# Altium footprint library PcbLibLafe.PcbLib: 297 footprints (part 10 of 19)
Each footprint in its own frame and in the unit in brackets; x right, y up, seen from the top. Pads: shape width x height; smd on the part's side, far side on the other; paste and mask are expansions set on the pad; w line width, h text height; cw(c..) or ccw(c..) is an arc to the next point about the centre after c.
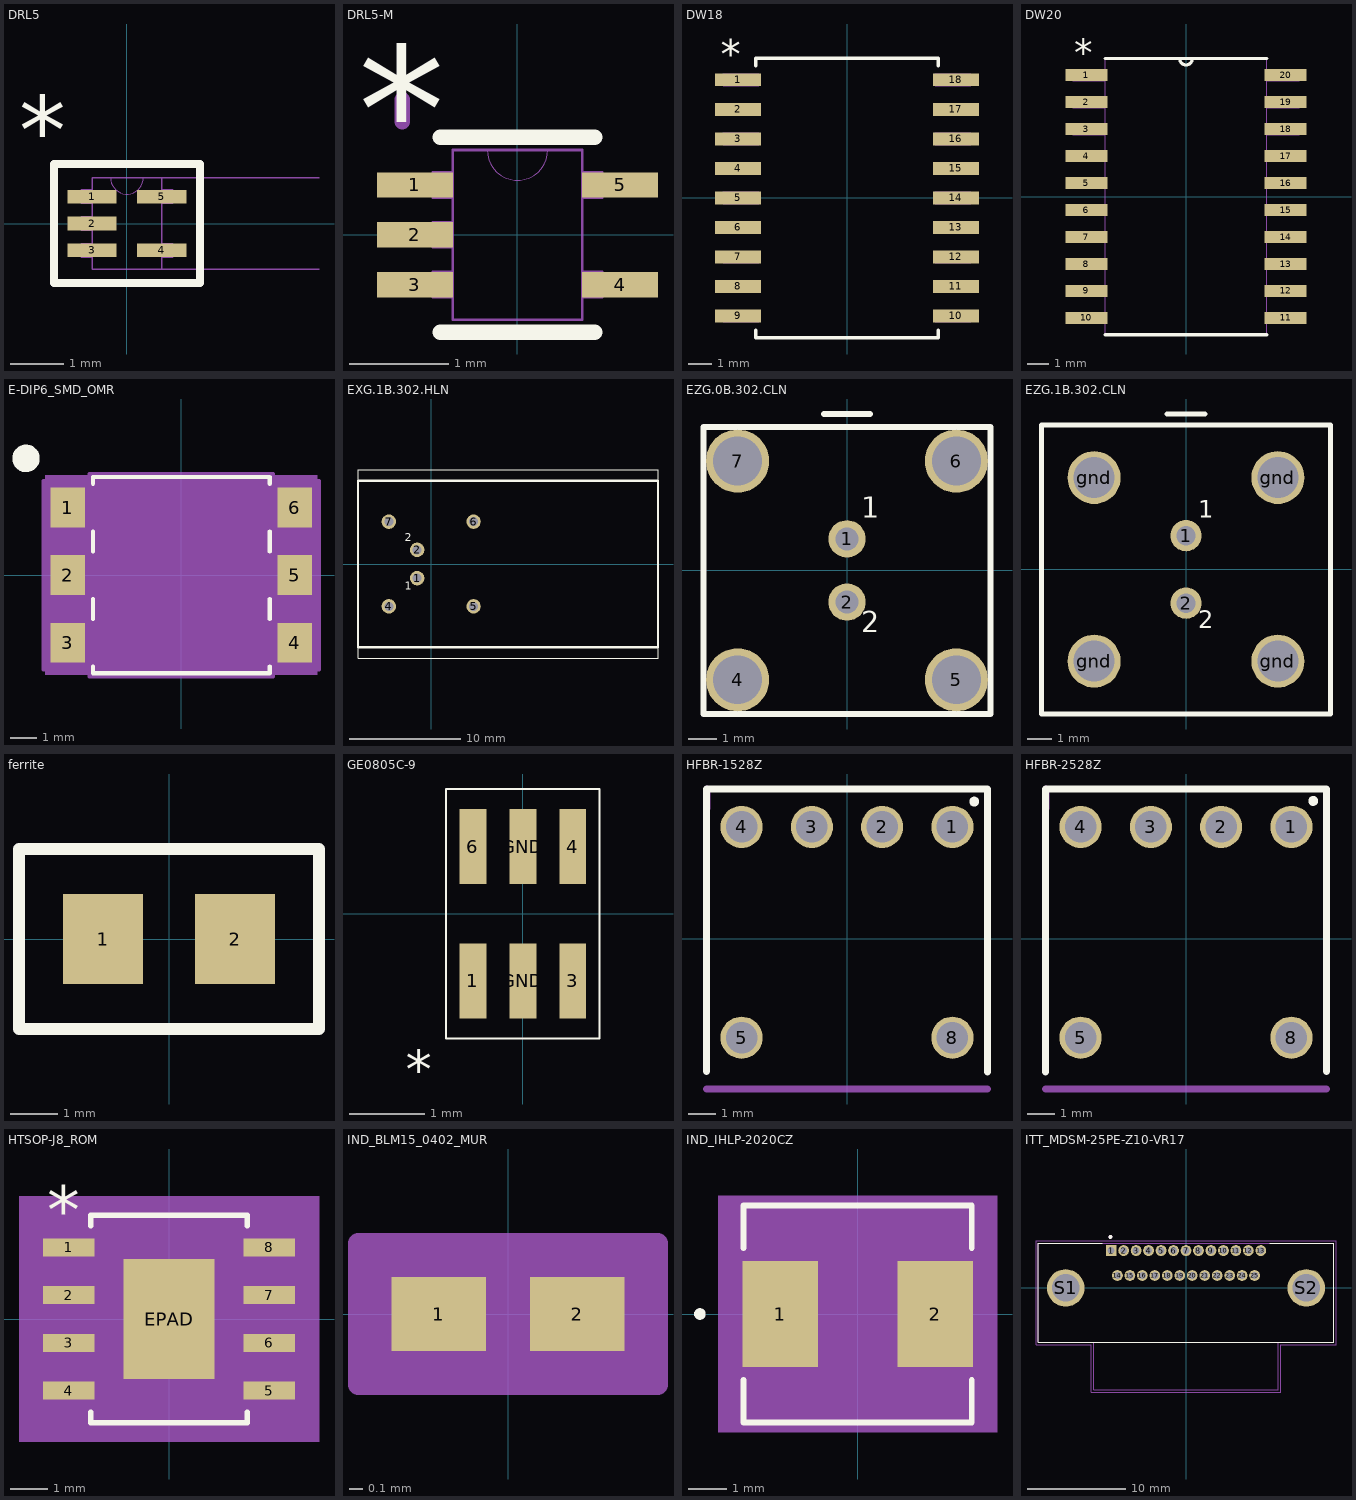
[diagram p9: the footprints below, top view; thin cyan lines are the x and y axes]

## DRL5 [mil]
pads (5):
  rect 36x10 smd mask+3: 1(-25.5,19.68) 2(-25.5,0) 3(-25.5,-19.68) 4(25.5,-19.68) 5(25.5,19.68)
Top Overlay:
  lines w6: -53.5,-43.5 53.5,-43.5 53.5,43.5 -53.5,43.5 -53.5,-43.5
  text "*" at -79,44 h50
Mechanical 7:
  lines w1: 0,-33.5 140.5,-33.5 ; 0,33.5 140.5,33.5
Mechanical 13:
  lines w0: -12,33.5 ccw(c0,33.5) 12,33.5
  lines w1: -33.5,-24.68 -25.5,-24.68 -25.5,-14.69 -33.5,-14.69 -33.5,-24.68 ; -33.5,-5 -25.5,-5 -25.5,5 -33.5,5 -33.5,-5 ; -33.5,14.69 -25.5,14.69 -25.5,24.68 -33.5,24.68 -33.5,14.69 ; -25.5,-33.5 -25.5,33.5 25.5,33.5 25.5,-33.5 -25.5,-33.5 ; 25.5,-24.68 33.5,-24.68 33.5,-14.69 25.5,-14.69 25.5,-24.68 ; 25.5,14.69 33.5,14.69 33.5,24.68 25.5,24.68 25.5,14.69
3D body: height 10, standoff 0, extent 0,0 10,10
3D body "DRL0005A.stp": height 23.62, standoff 0, extent -31.49,-31.49 31.51,31.5

## DRL5-M [mil]
pads (5):
  rect 30x10 smd paste+0 mask+0: 1(-40.5,19.68) 2(-40.5,0) 3(-40.5,-19.68) 4(40.5,-19.68) 5(40.5,19.68)
Top Overlay:
  lines w6: -30.5,-38.5 30.5,-38.5 ; -30.5,38.5 30.5,38.5
  text "*" at -63,24.68 h50
Mechanical 13:
  lines w0: -12,33.5 ccw(c0,33.5) 12,33.5
  lines w1: -33.5,-24.68 -25.5,-24.68 -25.5,-14.69 -33.5,-14.69 -33.5,-24.68 ; -33.5,-5 -25.5,-5 -25.5,5 -33.5,5 -33.5,-5 ; -33.5,14.69 -25.5,14.69 -25.5,24.68 -33.5,24.68 -33.5,14.69 ; -25.5,-33.5 -25.5,33.5 25.5,33.5 25.5,-33.5 -25.5,-33.5 ; 25.5,-24.68 33.5,-24.68 33.5,-14.69 25.5,-14.69 25.5,-24.68 ; 25.5,14.69 33.5,14.69 33.5,24.68 25.5,24.68 25.5,14.69
Mechanical 15:
  lines w6: -45.5,44.69 -45.5,53.5
3D body: height 10, standoff 0, extent 0,0 10,10
3D body "DRL0005A.stp": height 23.62, standoff 0, extent -31.49,-31.49 31.5,31.5

## DW18 [mil]
pads (18):
  rect 78x22 smd: 1(-184.5,200) 2(-184.5,150) 3(-184.5,100) 4(-184.5,50) 5(-184.5,0) 6(-184.5,-50) 7(-184.5,-100) 8(-184.5,-150) 9(-184.5,-200) 10(184.5,-200) 11(184.5,-150) 12(184.5,-100) 13(184.5,-50) 14(184.5,0) 15(184.5,50) 16(184.5,100) 17(184.5,150) 18(184.5,200)
Top Overlay:
  lines w6: -154.5,-224.1 -154.5,-236.5 154.5,-236.5 154.5,-224.1 ; -154.5,224.1 -154.5,236.5 154.5,236.5 154.5,224.1
  text "*" at -214,219 h50
Mechanical 13:
  lines w1: -209.5,-210 -149.5,-210 -149.5,-190 -209.5,-190 -209.5,-210 ; -209.5,-160 -149.5,-160 -149.5,-140 -209.5,-140 -209.5,-160 ; -209.5,-110 -149.5,-110 -149.5,-90 -209.5,-90 -209.5,-110 ; -209.5,-60 -149.5,-60 -149.5,-40 -209.5,-40 -209.5,-60 ; -209.5,-10 -149.5,-10 -149.5,10 -209.5,10 -209.5,-10 ; -209.5,40 -149.5,40 -149.5,60 -209.5,60 -209.5,40 ; -209.5,90 -149.5,90 -149.5,110 -209.5,110 -209.5,90 ; -209.5,140 -149.5,140 -149.5,160 -209.5,160 -209.5,140 ; -209.5,190 -149.5,190 -149.5,210 -209.5,210 -209.5,190 ; 149.5,-210 209.5,-210 209.5,-190 149.5,-190 149.5,-210 ; 149.5,-160 209.5,-160 209.5,-140 149.5,-140 149.5,-160 ; 149.5,-110 209.5,-110 209.5,-90 149.5,-90 149.5,-110 ; 149.5,-60 209.5,-60 209.5,-40 149.5,-40 149.5,-60 ; 149.5,-10 209.5,-10 209.5,10 149.5,10 149.5,-10 ; 149.5,40 209.5,40 209.5,60 149.5,60 149.5,40 ; 149.5,90 209.5,90 209.5,110 149.5,110 149.5,90 ; 149.5,140 209.5,140 209.5,160 149.5,160 149.5,140 ; 149.5,190 209.5,190 209.5,210 149.5,210 149.5,190
3D body "DW18.step": height 67.09, standoff 0, extent -208.48,-233.49 210.5,229.51

## DW20 [mil]
pads (20):
  rect 78x22 smd: 1(-184.5,225) 2(-184.5,175) 3(-184.5,125) 4(-184.5,75) 5(-184.5,25) 6(-184.5,-25) 7(-184.5,-75) 8(-184.5,-125) 9(-184.5,-175) 10(-184.5,-225) 11(184.5,-225) 12(184.5,-175) 13(184.5,-125) 14(184.5,-75) 15(184.5,-25) 16(184.5,25) 17(184.5,75) 18(184.5,125) 19(184.5,175) 20(184.5,225)
Top Overlay:
  lines w6: -149.5,-256 149.5,-256 ; -149.5,256 149.5,256 ; -12,256 ccw(c0,256) 12,256
  text "*" at -207,242 h50
Mechanical 13:
  lines w0: -12,256 ccw(c0,256) 12,256
  lines w1: -209.5,-235 -209.5,-215 -149.5,-215 -149.5,-235 -209.5,-235 ; -209.5,-185 -209.5,-165 -149.5,-165 -149.5,-185 -209.5,-185 ; -209.5,-135 -209.5,-115 -149.5,-115 -149.5,-135 -209.5,-135 ; -209.5,-85 -209.5,-65 -149.5,-65 -149.5,-85 -209.5,-85 ; -209.5,-35 -209.5,-15 -149.5,-15 -149.5,-35 -209.5,-35 ; -209.5,15 -209.5,35 -149.5,35 -149.5,15 -209.5,15 ; -209.5,65 -209.5,85 -149.5,85 -149.5,65 -209.5,65 ; -209.5,115 -209.5,135 -149.5,135 -149.5,115 -209.5,115 ; -209.5,165 -209.5,185 -149.5,185 -149.5,165 -209.5,165 ; -209.5,215 -209.5,235 -149.5,235 -149.5,215 -209.5,215 ; -149.5,-256 149.5,-256 149.5,256 -149.5,256 -149.5,-256 ; 149.5,-235 149.5,-215 209.5,-215 209.5,-235 149.5,-235 ; 149.5,-185 149.5,-165 209.5,-165 209.5,-185 149.5,-185 ; 149.5,-135 149.5,-115 209.5,-115 209.5,-135 149.5,-135 ; 149.5,-85 149.5,-65 209.5,-65 209.5,-85 149.5,-85 ; 149.5,-35 149.5,-15 209.5,-15 209.5,-35 149.5,-35 ; 149.5,15 149.5,35 209.5,35 209.5,15 149.5,15 ; 149.5,65 149.5,85 209.5,85 209.5,65 149.5,65 ; 149.5,115 149.5,135 209.5,135 209.5,115 149.5,115 ; 149.5,165 149.5,185 209.5,185 209.5,165 149.5,165 ; 149.5,215 149.5,235 209.5,235 209.5,215 149.5,215
  text "*" at -207,242 h50
3D body: height 10, standoff 0, extent 0,0 10,10
3D body "DW0020A.stp": height 68.9, standoff 0, extent -203.33,-251.96 203.34,251.97

## E-DIP6_SMD_OMR [mm]
pads (6):
  rect 1.3x1.5 smd paste+0 mask+0: 1(-4.275,2.54) 2(-4.275,0) 3(-4.275,-2.54) 4(4.275,-2.54) 5(4.275,0) 6(4.275,2.54)
Top Overlay:
  circle w0.508: c-5.842,4.394 r0.262
  lines w0.152: -3.327,-3.438 -3.327,-3.687 3.327,-3.687 3.327,-3.438 ; -3.327,-1.642 -3.327,-0.898 ; -3.327,0.898 -3.327,1.642 ; -3.327,3.438 -3.327,3.687 3.327,3.687 3.327,3.438 ; 3.327,-1.642 3.327,-0.898 ; 3.327,0.898 3.327,1.642
Mechanical 5:
  region: 5.115,-3.751 -5.115,-3.751 -5.115,3.751 5.115,3.751
Mechanical 13:
  lines w0: -0.305,3.56 ccw(c0,3.56) 0.305,3.56
  lines w0.025: -3.2,-3.56 -3.2,3.56 3.2,3.56 3.2,-3.56 -3.2,-3.56
Mechanical 15:
  region: -3.454,-3.544 -5.179,-3.544 -5.179,3.544 -3.454,3.544 -3.454,3.814 3.454,3.814 3.454,3.544 5.179,3.544 5.179,-3.544 3.454,-3.544 3.454,-3.814 -3.454,-3.814
  lines w0.152: -5.179,-3.544 -3.454,-3.544 -3.454,-3.814 3.454,-3.814 3.454,-3.544 5.179,-3.544 5.179,3.544 3.454,3.544 3.454,3.814 -3.454,3.814 -3.454,3.544 -5.179,3.544 -5.179,-3.544
3D body "E-DIP6_SMD_OMR.step": height 4.25, standoff 0, extent -4.575,-3.56 4.575,3.56

## EXG.1B.302.HLN [mil]
pads (6):
  round 51.18 hole 31.5: 1(-50,-50) 2(-50,50) 4(-150,-150) 5(150,-150) 6(150,150) 7(-150,150)
Top Overlay:
  lines w3.94: -259.45,-334.65 -259.45,334.65 803.54,334.65 803.54,-334.65 -259.45,-334.65
  lines w7.87: -259.45,-295.28 -259.45,295.28 803.54,295.28 803.54,-295.28 -259.45,-295.28
  text "2" at -93.31,69.69 h48.83
  text "1" at -93.31,-101.18 h48.83

## EZG.0B.302.CLN [mil]
pads (6):
  round 51.18 hole 31.5: 1(0,43.31) 2(0,-43.31)
  round 86.61 hole 66.93: 4(-150,-150) 5(150,-150) 6(150,150) 7(-150,150)
Top Overlay:
  lines w7.87: -31.5,214.57 31.5,214.57 ; -196.85,-196.85 196.85,-196.85 196.85,196.85 -196.85,196.85 -196.85,-196.85
  text "1" at 19.69,62.99 h48.83
  text "2" at 19.69,-94.49 h48.83

## EZG.1B.302.CLN [mil]
pads (6):
  round 51.18 hole 31.5: 1(0,55.12) 2(0,-55.12)
  round 86.61 hole 66.93: gnd(-150,-150) gnd(-150,150) gnd(150,-150) gnd(150,150)
Top Overlay:
  lines w7.87: -31.5,253.94 31.5,253.94 ; -236.22,-236.22 236.22,-236.22 236.22,236.22 -236.22,236.22 -236.22,-236.22
  text "1" at 19.69,74.8 h48.83
  text "2" at 19.69,-106.3 h48.83
3D body "ezg_1b_302_cln.stp": height 800, standoff -97.64, extent -236.22,-236.22 236.22,236.22

## ferrite [mm]
pads (2):
  rect 1.7x1.9 smd: 1(-1.397,0) 2(1.397,0)
Top Overlay:
  lines w0.254: -3.175,-1.905 -3.175,1.905 3.175,1.905 3.175,-1.905 -3.175,-1.905

## GE0805C-9 [mil]
pads (6):
  rect 14x39 smd: 1(-26,-35) 3(26,-35) 4(26,35) 6(-26,35) GND(0,-35) GND(0,35)
Top Overlay:
  lines w1: -40,-65 -40,65 40,65 40,-65 -40,-65
  text "*" at -61,-91.33 h20

## HFBR-1528Z [mil] "HFBR Transmitter"
height 300
pads (6):
  round 60 hole 45: 1(150,158.96) 2(50,158.96) 3(-50,158.96) 4(-150,158.96) 5(-150,-141.04) 8(150,-141.04)
Top Overlay:
  circle w10: c181,195 r2
  lines w10: -200,-189 -200,212.96 200,212.96 200,-190
Mechanical 1:
  lines w10: -199,184.96 -199,212.96
Mechanical 3:
  lines w10: -200,-214.04 200,-214.04

## HFBR-2528Z [mil] "HFBR Receiver"
height 300
pads (6):
  round 60 hole 45: 1(150,158.96) 2(50,158.96) 3(-50,158.96) 4(-150,158.96) 5(-150,-141.04) 8(150,-141.04)
Top Overlay:
  circle w10: c181,196 r2
  lines w10: -200,-190 -200,212.96 200,212.96 200,-189
Mechanical 1:
  lines w10: -199,184.96 -199,212.96
Mechanical 3:
  lines w10: -200,-214.04 200,-214.04

## HTSOP-J8_ROM [mil]
pads (9):
  rect 54x19 smd paste+0 mask+0: 1(-105,75) 2(-105,25) 3(-105,-25) 4(-105,-75) 5(105,-75) 6(105,-25) 7(105,25) 8(105,75)
  rect 95x126 smd paste-62.5 mask+0: EPAD(0,0)
Top Overlay:
  lines w6: -82,-97.6 -82,-108.5 82,-108.5 82,-97.6 ; -82,97.6 -82,108.5 82,108.5 82,97.6
  text "*" at -127.5,89 h50
Top Paste:
  region: 43.56,-3.94 -43.56,-3.94 -43.56,-59.06 43.56,-59.06
  region: 43.56,59.06 -43.56,59.06 -43.56,3.94 43.56,3.94
Mechanical 5:
  region: 157,-128.5 -157,-128.5 -157,128.5 157,128.5
Mechanical 13:
  lines w0: -12,103.5 ccw(c0,103.5) 12,103.5
  lines w1: -118,-83.5 -77,-83.5 -77,-66.5 -118,-66.5 -118,-83.5 ; -118,-33.5 -77,-33.5 -77,-16.5 -118,-16.5 -118,-33.5 ; -118,16.5 -77,16.5 -77,33.5 -118,33.5 -118,16.5 ; -118,66.5 -77,66.5 -77,83.5 -118,83.5 -118,66.5 ; -77,-103.5 -77,103.5 77,103.5 77,-103.5 -77,-103.5 ; 77,-83.5 118,-83.5 118,-66.5 77,-66.5 77,-83.5 ; 77,-33.5 118,-33.5 118,-16.5 77,-16.5 77,-33.5 ; 77,16.5 118,16.5 118,33.5 77,33.5 77,16.5 ; 77,66.5 118,66.5 118,83.5 77,83.5 77,66.5
  text "*" at -74.5,50.5 h50
Mechanical 15:
  region: -87,-94.5 -142,-94.5 -142,94.5 -87,94.5 -87,113.5 87,113.5 87,94.5 142,94.5 142,-94.5 87,-94.5 87,-113.5 -87,-113.5
  lines w6: -142,-94.5 -87,-94.5 -87,-113.5 87,-113.5 87,-94.5 142,-94.5 142,94.5 87,94.5 87,113.5 -87,113.5 -87,94.5 -142,94.5 -142,-94.5
3D body "HTSOP-J8_ROM.step": height 39.09, standoff 0, extent -117.99,-103.5 117.99,103.5

## IND_BLM15_0402_MUR [mil]
pads (2):
  rect 28x22 smd paste+0 mask+0: 1(-20.5,0) 2(20.5,0)
Mechanical 13:
  lines w1: -20.5,-11 -20.5,11 ; -20.5,-11 20.5,-11 ; -20.5,-11 -6.5,-11 -6.5,11 -20.5,11 ; -20.5,-11 -20.5,11 ; -20.5,11 20.5,11 ; 20.5,-11 20.5,11 ; 20.5,-11 20.5,11 ; 20.5,-11 6.5,-11 6.5,11 20.5,11
Mechanical 15:
  region: 44.5,-21 -44.5,-21 -44.5,21 44.5,21
  lines w6: -44.5,-21 44.5,-21 44.5,21 -44.5,21 -44.5,-21
3D body "IND_BLM15_0402_MUR.step": height 22.01, standoff 0, extent -20.51,-10.98 20.51,10.98

## IND_IHLP-2020CZ [mil]
pads (2):
  rect 78x110 smd paste+0 mask+0: 1(-80,0) 2(80,0)
Top Overlay:
  circle w6: c-163,0 r3
  lines w6: -118,-68.1 -118,-112 118,-112 118,-68.1 ; -118,68.1 -118,112 118,112 118,68.1
Mechanical 5:
  region: 144,-122 -144,-122 -144,122 144,122
Mechanical 13:
  circle w0: c-93,0 r3
  lines w1: -113,-107 -113,107 113,107 113,-107 -113,-107
Mechanical 15:
  region: -123,-65 -129,-65 -129,65 -123,65 -123,117 123,117 123,65 129,65 129,-65 123,-65 123,-117 -123,-117
  lines w6: -129,-65 -123,-65 -123,-117 123,-117 123,-65 129,-65 129,65 123,65 123,117 -123,117 -123,65 -129,65 -129,-65
3D body "IND_IHLP-2020CZ.step": height 120, standoff 0, extent -112.99,-107.01 112.99,107.01

## ITT_MDSM-25PE-Z10-VR17 [mm]
pads (27):
  rect 1.1x1.1 hole 0.7: 1(-7.62,3.81)
  round 1.1 hole 0.7: 2(-6.35,3.81) 3(-5.08,3.81) 4(-3.81,3.81) 5(-2.54,3.81) 6(-1.27,3.81) 7(0,3.81) 8(1.27,3.81) 9(2.54,3.81) 10(3.81,3.81) 11(5.08,3.81) 12(6.35,3.81) 13(7.62,3.81) 14(-6.985,1.27) 15(-5.715,1.27) 16(-4.445,1.27) 17(-3.175,1.27) 18(-1.905,1.27) 19(-0.635,1.27) 20(0.635,1.27) 21(1.905,1.27) 22(3.175,1.27) 23(4.445,1.27) 24(5.715,1.27) 25(6.985,1.27)
  round 3.816 hole 2.8: S1(-12.25,0) S2(12.25,0)
Top Overlay:
  circle w0.2: c-7.7,5.2 r0.1
  lines w0.127: -8.55,4.57 -15.025,4.57 -15.025,-5.53 15.025,-5.53 15.025,4.57 8.55,4.57
Mechanical 13:
  circle w0.2: c-7.7,5.2 r0.1
  lines w0.127: -9.4,-5.53 9.4,-5.53 ; -9.4,-5.53 -15.025,-5.53 -15.025,4.57 15.025,4.57 15.025,-5.53 9.4,-5.53 ; -9.4,-5.53 -9.4,-10.35 9.4,-10.35 9.4,-5.53
Mechanical 15:
  lines w0.05: -15.275,-5.78 -9.65,-5.78 -9.65,-10.6 9.65,-10.6 9.65,-5.78 15.275,-5.78 15.275,4.82 -15.275,4.82 -15.275,-5.78
3D body "MDSM-25PE-Z10-VR17.step": height 8.21, standoff -2.29, extent -15.064,-13.622 14.986,4.478